# Altium footprint library rcl.PCBLIB: 513 footprints (part 26 of 33)
Each footprint in its own frame and in the unit in brackets; x right, y up, seen from the top. Pads: shape width x height; smd on the part's side, far side on the other; paste and mask are expansions set on the pad; w line width, h text height; cw(c..) or ccw(c..) is an arc to the next point about the centre after c.
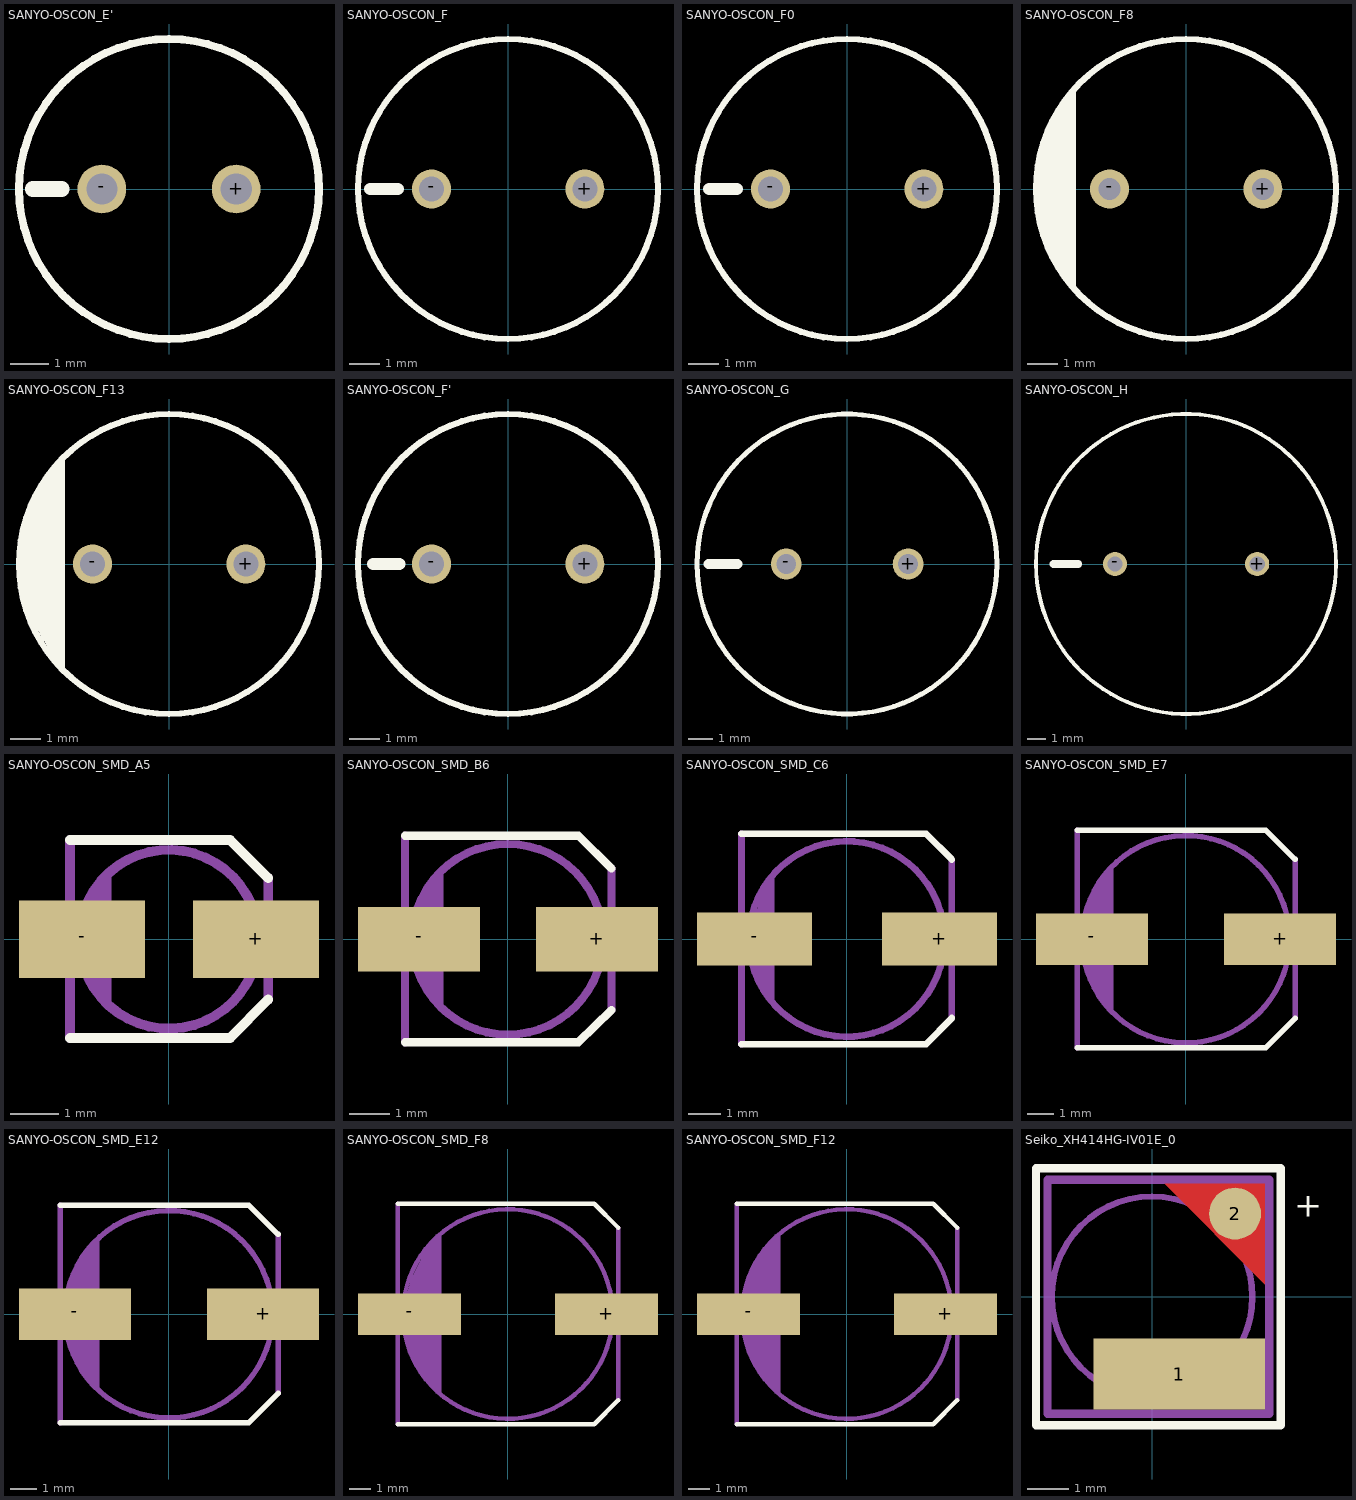
[diagram p25: the footprints below, top view; thin cyan lines are the x and y axes]

## SANYO-OSCON_E' [mil]
pads (2):
  round 50 hole 32: +(69,0) -(-68.9,0)
Top Overlay:
  circle w8: c0,0 r154
  lines w16: -139.76,0 -110.24,0

## SANYO-OSCON_F [mil]
pads (2):
  round 50 hole 32: +(99,0) -(-98.43,0)
Top Overlay:
  circle w8: c0,0 r193
  lines w16: -177.17,0 -141.73,0

## SANYO-OSCON_F0 [mil]
pads (2):
  round 50 hole 32: +(99,0) -(-98.43,0)
Top Overlay:
  circle w8: c0,0 r193
  lines w16: -177.17,0 -141.73,0

## SANYO-OSCON_F8 [mil]
pads (2):
  round 50 hole 28: +(99,0) -(-98.43,0)
Top Overlay:
  circle w8: c0,0 r193
  region: -141.73,126 -141.73,-127.95 -147.54,-121.4 -157.95,-107.3 -167.05,-92.33 -174.77,-76.61 -181.06,-60.25 -185.87,-43.41 -189.14,-26.19 -190.87,-8.76 -190.94,0 -190.87,8.65 -189.15,25.86 -185.87,42.85 -181.07,59.47 -174.78,75.58 -167.05,91.06 -157.94,105.77 -147.54,119.59

## SANYO-OSCON_F13 [mil]
pads (2):
  round 50 hole 32: +(99,0) -(-98.43,0)
Top Overlay:
  circle w8: c0,0 r193
  region: -133.86,136 -133.86,-133.86 -140.27,-127.13 -151.85,-112.57 -162.07,-97.03 -170.87,-80.65 -178.16,-63.54 -183.9,-45.85 -188.03,-27.72 -190.53,-9.29 -190.94,0 -190.63,9.43 -188.28,28.14 -184.25,46.57 -178.56,64.55 -171.25,81.94 -162.4,98.6 -152.08,114.39 -140.36,129.17

## SANYO-OSCON_F' [mil]
pads (2):
  round 50 hole 32: +(99,0) -(-98.43,0)
Top Overlay:
  circle w8: c0,0 r193
  lines w16: -173.23,0 -139.76,0

## SANYO-OSCON_G [mil]
pads (2):
  round 50 hole 32: +(99,0) -(-98.43,0)
Top Overlay:
  circle w8: c0,0 r243
  lines w16: -224.41,0 -177.17,0

## SANYO-OSCON_H [mil]
pads (2):
  round 50 hole 32: +(148,0) -(-147.64,0)
Top Overlay:
  circle w8: c0,0 r312
  lines w16: -275.59,0 -224.41,0

## SANYO-OSCON_SMD_A5 [mil]
pads (2):
  rect 103x63 smd: +(71,0) -(-70.87,0)
Top Overlay:
  lines w8: -80.71,-80.71 50,-80.71 81,-49.21 ; -80.71,81 50,81 81,50
Mechanical 4:
  circle w8: c0,0 r73
  region: -47.24,-53.15 -47.24,54 -52.7,48.73 -61.36,36.28 -67.44,22.39 -70.7,7.58 -70.87,0 -70.29,-7.41 -66.64,-21.82 -60.61,-35.4 -52.36,-47.76
  lines w8: -80.71,-80.71 -80.71,81 ; 81,-49.21 81,50

## SANYO-OSCON_SMD_B6 [mil]
pads (2):
  rect 119x63 smd: +(87,0) -(-86.61,0)
Top Overlay:
  lines w8: -100.39,-100.39 69,-100.39 101,-68.9 ; -100.39,101 69,101 101,69
Mechanical 4:
  circle w8: c0,0 r93
  region: -62.99,-64.96 -62.99,65 -68.89,58.21 -78.41,42.96 -85.43,26.4 -89.77,8.96 -90.55,0 -90.26,-9.05 -86.38,-26.72 -79.31,-43.39 -69.3,-58.47
  lines w8: -100.39,-100.39 -100.39,101 ; 101,-68.9 101,69

## SANYO-OSCON_SMD_C6 [mil]
pads (2):
  rect 138x63 smd: +(111,0) -(-110.24,0)
Top Overlay:
  lines w8: -125.98,-125.98 95,-125.98 126,-94.49 ; -125.98,126 95,126 126,95
Mechanical 4:
  circle w8: c0,0 r117
  region: -86.61,75 -86.61,-74.8 -92.9,-66.89 -102.6,-49.17 -109.14,-30.05 -112.33,-10.1 -112.2,0 -112.06,10.09 -108.62,29.98 -102.11,49.08 -92.67,66.93
  lines w8: -125.98,-125.98 -125.98,126 ; 126,-94.49 126,95

## SANYO-OSCON_SMD_E7 [mil]
pads (2):
  rect 164x75 smd: +(138,0) -(-137.8,0)
Top Overlay:
  lines w8: -159.45,-159.45 117,-159.45 160,-116.14 ; -159.45,160 117,160 160,117
Mechanical 4:
  circle w8: c0,0 r152
  region: -106.3,105 -106.3,-104.33 -111.55,-99.3 -120.95,-88.2 -129.16,-76.2 -136.08,-63.41 -141.66,-49.98 -145.82,-36.05 -148.53,-21.76 -149.75,-7.27 -149.61,0 -149.55,7.28 -148.05,21.77 -145.17,36.04 -140.93,49.98 -135.38,63.44 -128.56,76.31 -120.54,88.47 -111.4,99.8
  lines w8: -159.45,-159.45 -159.45,160 ; 160,-116.14 160,117

## SANYO-OSCON_SMD_E12 [mil]
pads (2):
  rect 164x75 smd: +(138,0) -(-137.8,0)
Top Overlay:
  lines w8: -159.45,-159.45 117,-159.45 160,-116.14 ; -159.45,160 117,160 160,117
Mechanical 4:
  circle w8: c0,0 r152
  region: -102.36,-108.27 -102.36,109 -107.96,103.74 -118.06,92.18 -126.98,79.69 -134.64,66.39 -140.96,52.39 -145.87,37.85 -149.34,22.9 -151.33,7.67 -151.57,0 -151.33,-7.63 -149.35,-22.77 -145.88,-37.65 -140.96,-52.11 -134.64,-66.01 -126.98,-79.22 -118.06,-91.61 -107.95,-103.07
  lines w8: -159.45,-159.45 -159.45,160 ; 160,-116.14 160,117

## SANYO-OSCON_SMD_F8 [mil]
pads (2):
  rect 186x75 smd: +(178,0) -(-177.17,0)
Top Overlay:
  lines w8: -198.82,-198.82 156,-198.82 199,-155.51 ; -198.82,199 156,199 199,156
Mechanical 4:
  circle w8: c0,0 r189
  region: -120.08,-143.7 -120.08,144 -127.33,136.9 -140.51,121.45 -152.23,104.88 -162.42,87.32 -170.97,68.91 -177.83,49.8 -182.94,30.15 -186.26,10.12 -187.01,0 -186.4,-10.13 -183.28,-30.2 -178.29,-49.88 -171.48,-69.01 -162.91,-87.41 -152.65,-104.93 -140.79,-121.41 -127.44,-136.71
  lines w8: -198.82,-198.82 -198.82,199 ; 199,-155.51 199,156

## SANYO-OSCON_SMD_F12 [mil]
pads (2):
  rect 186x75 smd: +(178,0) -(-177.17,0)
Top Overlay:
  lines w8: -198.82,-198.82 156,-198.82 199,-155.51 ; -198.82,199 156,199 199,156
Mechanical 4:
  circle w8: c0,0 r189
  region: -120.08,-143.7 -120.08,144 -127.84,137.32 -141.86,122.39 -154.21,106.06 -164.77,88.51 -173.4,69.94 -180.01,50.55 -184.53,30.58 -186.91,10.24 -187.01,0 -186.48,-10.15 -183.48,-30.25 -178.57,-49.98 -171.8,-69.14 -163.22,-87.57 -152.91,-105.09 -140.97,-121.54 -127.51,-136.77
  lines w8: -198.82,-198.82 -198.82,199 ; 199,-155.51 199,156

## Seiko_XH414HG-IV01E_0 [mm]
pads (2):
  rect 4.1x1.7 smd paste+0 mask+0: 1(0.65,-1.85)
  round 1.241 smd paste+0 mask+0: 2(1.987,1.987)
Top Layer:
  region: 0.3,2.7 2.7,2.7 2.7,0.3
Top Overlay:
  lines w0.2: -2.775,-3.075 -2.775,3.075 3.075,3.075 3.075,-3.075 -2.775,-3.075
  text "+" at 3.4,1.725 h1
Mechanical 10:
  lines w0.2: -2.5,-2.8 -2.5,2.8 2.8,2.8 2.8,-2.8 -2.5,-2.8
Mechanical 12:
  circle w0.15: c0,0 r2.4
Mechanical 15:
  lines w0.2: -2.5,-2.8 -2.5,2.8 2.8,2.8 2.8,-2.8 -2.5,-2.8
3D body "Cap_Seiko_XH414HG-IV01E_eec.STEP": height 0.25, standoff 0, extent -2.5,-2.8 2.8,2.8